# Altium footprint library AI.PcbLib: 137 footprints (part 8 of 9)
Each footprint in its own frame and in the unit in brackets; x right, y up, seen from the top. Pads: shape width x height; smd on the part's side, far side on the other; paste and mask are expansions set on the pad; w line width, h text height; cw(c..) or ccw(c..) is an arc to the next point about the centre after c.
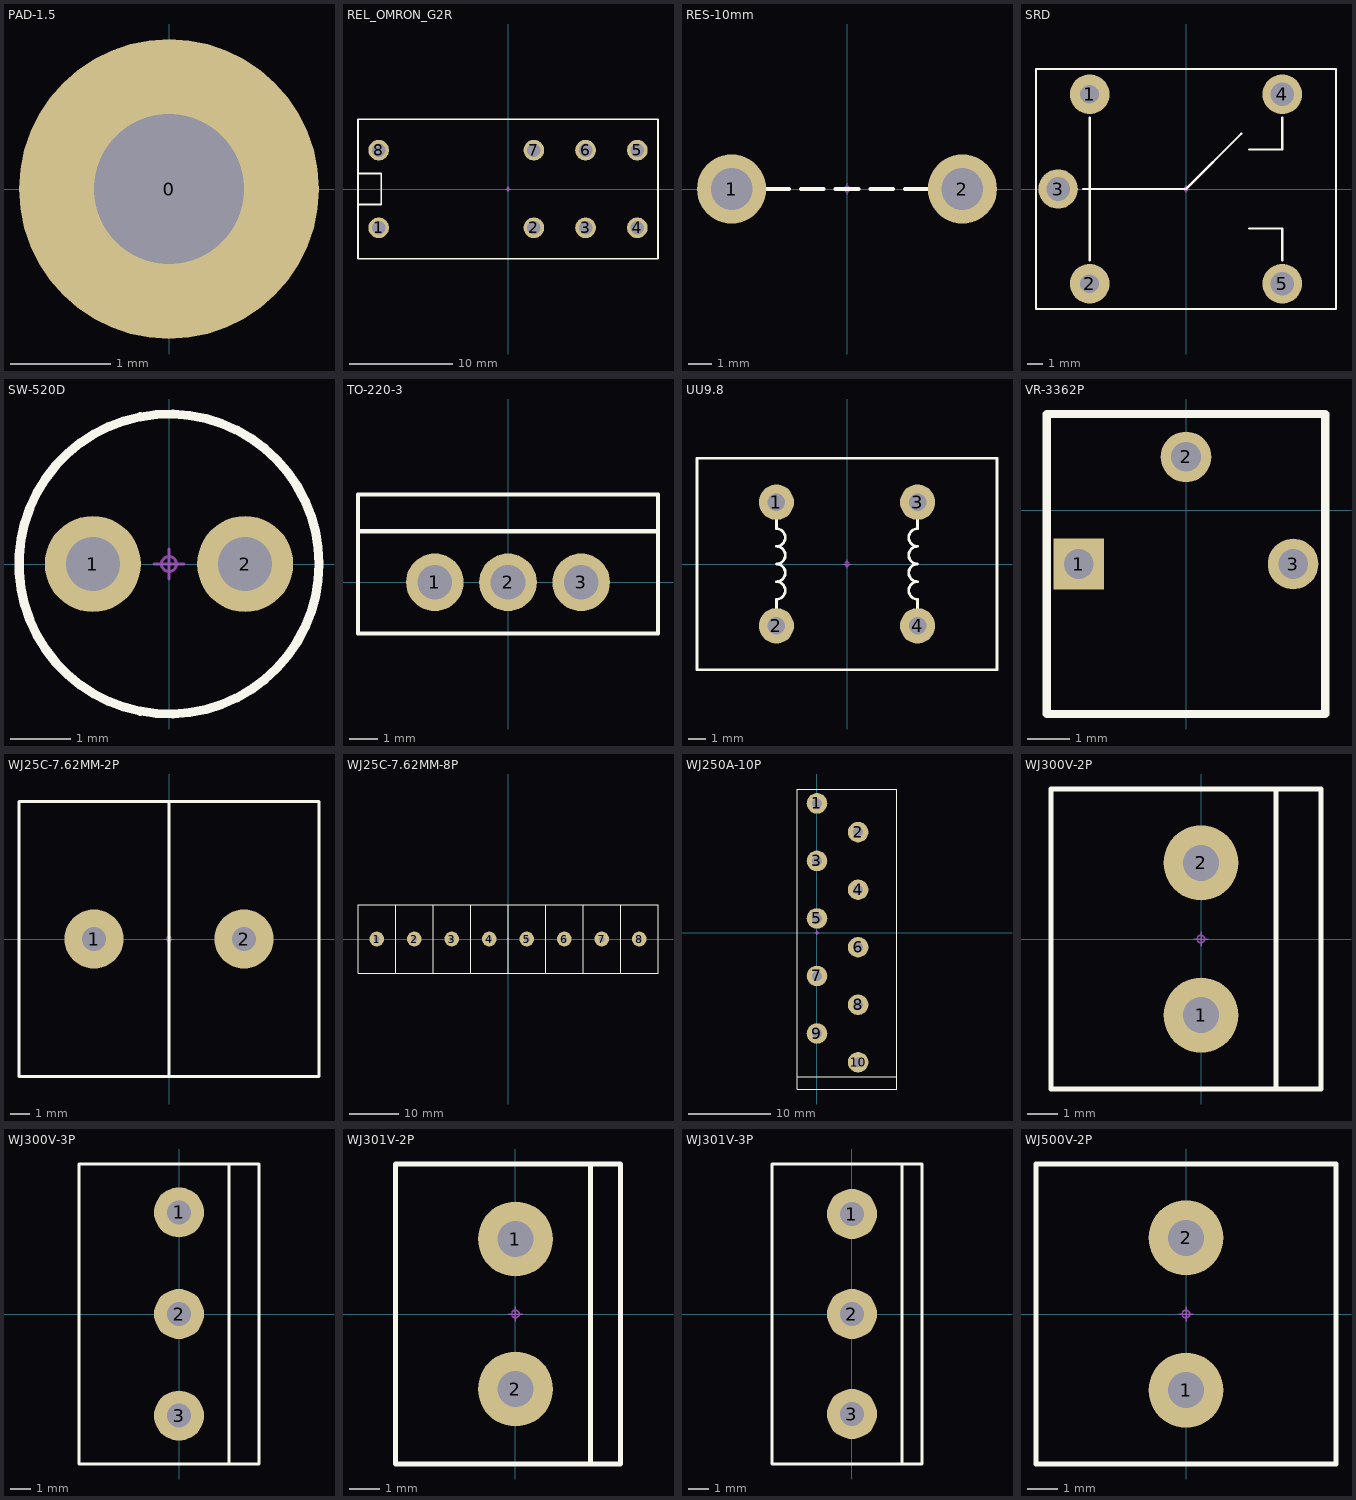
[diagram p7: the footprints below, top view; thin cyan lines are the x and y axes]

## PAD-1.5 [mm]
pads (1):
  round 3 hole 1.5: 0(0,0)
Mechanical 15:
  circle w0.05: c0,0 r0.125
  lines w0.05: -0.25,0 0.25,0 ; 0,-0.25 0,0.25

## REL_OMRON_G2R [mm]
pads (8):
  round 2 hole 1.3: 1(-12.5,-3.75) 2(2.5,-3.75) 3(7.5,-3.75) 4(12.5,-3.75) 5(12.5,3.75) 6(7.5,3.75) 7(2.5,3.75) 8(-12.5,3.75)
Top Overlay:
  lines w0.152: -14.5,-1.5 -12.25,-1.5 -12.25,1.5 -14.5,1.5 ; -14.5,-6.75 -14.5,6.75 14.5,6.75 14.5,-6.75 -14.5,-6.75
Mechanical 15:
  circle w0.05: c0,0 r0.125
  lines w0.05: -0.25,0 0.25,0 ; 0,-0.25 0,0.25
3D body "REL_OMRON_G2RG-2A4.stp": height 25.5, standoff -3.6, extent -14.5,-6.75 14.5,6.75

## RES-10mm [mm]
pads (2):
  round 3 hole 1.8: 1(-5,0) 2(5,0)
Top Overlay:
  lines w0.152: -3.5,0 -2.5,0 ; -2,0 -1,0 ; -0.5,0 0.5,0 ; 1,0 2,0 ; 2.5,0 3.5,0
Mechanical 15:
  circle w0.05: c0,0 r0.125
  lines w0.05: -0.25,0 0.25,0 ; 0,-0.25 0,0.25
3D body "RES1016-720X250.stp": height 2.5, standoff -3.2, extent -5.38,-1.25 5.38,1.25

## SRD [mm]
pads (5):
  round 2.5 hole 1.2: 1(-6.1,6) 2(-6.1,-6)
  round 2.5 hole 1.5: 3(-8.1,0) 4(6.1,6) 5(6.1,-6)
Top Overlay:
  lines w0.152: -6.5,0 0,0 3.5,3.5 ; -6.1,-4.5 -6.1,4.5 ; 4,-2.5 6.1,-2.5 6.1,-4.5 ; 4,2.5 6.1,2.5 6.1,4.5 ; -9.5,-7.6 9.5,-7.6 9.5,7.6 -9.5,7.6 -9.5,-7.6
Mechanical 15:
  circle w0.05: c0,0 r0.125
  lines w0.05: -0.25,0 0.25,0 ; 0,-0.25 0,0.25
3D body "User Library-SONGLE Relay SRU-12VDC-SL-C.STEP": height 15.3, standoff -5, extent -9.5,-7.75 9.6,7.75

## SW-520D [mm]
pads (2):
  round 1.6 hole 0.9: 1(-1.27,0) 2(1.27,0)
Top Overlay:
  circle w0.152: c0,0 r2.5
Mechanical 15:
  circle w0.05: c0,0 r0.125
  lines w0.05: -0.25,0 0.25,0 ; 0,-0.25 0,0.25
3D body "sw-520d.stp": height 12, standoff -12, extent -2.5,-2.5 2.5,2.5

## TO-220-3 [mm]
pads (3):
  round 2 hole 1.2: 1(-2.54,0) 2(0,0) 3(2.54,0)
Top Overlay:
  lines w0.152: -5.207,1.778 5.207,1.778 ; -5.207,-1.778 -5.207,3.048 5.207,3.048 5.207,-1.778 -5.207,-1.778
Mechanical 14:
  lines w0.1: -5.207,1.778 5.207,1.778 ; -5.207,-1.778 -5.207,3.048 5.207,3.048 5.207,-1.778 -5.207,-1.778
Mechanical 15:
  circle w0.05: c0,0 r0.125
  lines w0.05: -0.25,0 0.25,0 ; 0,-0.25 0,0.25
3D body "TO-220-V.stp": height 20.5, standoff -3.5, extent -5.27,-1.75 5.27,2.95

## UU9.8 [mm]
pads (4):
  round 2 hole 1: 1(-4,3.5) 2(-4,-3.5) 3(4,3.5) 4(4,-3.5)
Top Overlay:
  lines w0.152: -4,-2.5 -4,-2 ccw(c-4,-1.5) -4,-1 ccw(c-4,-0.5) -4,0 ccw(c-4,0.5) -4,1 ccw(c-4,1.5) -4,2 -4,2.5 ; 4,-2.5 4,-2.5 ; 4,-2.5 4,-2 cw(c4,-1.5) 4,-1 cw(c4,-0.5) 4,0 cw(c4,0.5) 4,1 cw(c4,1.5) 4,2 4,2.5 ; 4,2.5 4,2.5 ; -8.5,-6 -8.5,6 8.5,6 8.5,-6 -8.5,-6
Mechanical 15:
  circle w0.05: c0,0 r0.125
  lines w0.05: -0.25,0 0.25,0 ; 0,-0.25 0,0.25

## VR-3362P [mm] "Feed-Through Capacitor; 3 Leads"
pads (3):
  rect 1.2x1.2 hole 0.7: 1(-2.54,-1.27)
  round 1.2 hole 0.7: 2(0,1.27) 3(2.54,-1.27)
Top Overlay:
  lines w0.2: -3.302,-4.826 -3.302,2.286 3.302,2.286 3.302,-4.826 -3.302,-4.826

## WJ25C-7.62MM-2P [mm] "ONSHORE"
height 13
pads (2):
  round 3 hole 1.2: 1(-3.81,0) 2(3.81,0)
Top Overlay:
  lines w0.152: 0,-6.985 0,6.985 ; -7.62,-6.985 7.62,-6.985 7.62,6.985 -7.62,6.985 -7.62,-6.985
Mechanical 15:
  circle w0.05: c0,0 r0.125
  lines w0.05: -0.25,0 0.25,0 ; 0,-0.25 0,0.25

## WJ25C-7.62MM-8P [mm] "ONSHORE"
height 13
pads (8):
  round 3 hole 1.2: 1(-26.67,0) 2(-19.05,0) 3(-11.43,0) 4(-3.81,0) 5(3.81,0) 6(11.43,0) 7(19.05,0) 8(26.67,0)
Top Overlay:
  lines w0.152: -22.86,-6.985 -22.86,6.985 ; -15.24,-6.985 -15.24,6.985 ; -7.62,-6.985 -7.62,6.985 ; 0,-6.985 0,6.985 ; 7.62,-6.985 7.62,6.985 ; 15.24,-6.985 15.24,6.985 ; 22.86,-6.985 22.86,6.985 ; -30.48,-6.985 30.48,-6.985 30.48,6.985 -30.48,6.985 -30.48,-6.985
Mechanical 15:
  circle w0.05: c0,0 r0.125
  lines w0.05: -0.25,0 0.25,0 ; 0,-0.25 0,0.25

## WJ250A-10P [mm] "ONSHORE"
height 13
pads (10):
  round 2.5 hole 1.2: 1(0,15.75) 2(5,12.25) 3(0,8.75) 4(5,5.25) 5(0,1.75) 6(5,-1.75) 7(0,-5.25) 8(5,-8.75) 9(0,-12.25) 10(5,-15.75)
Top Overlay:
  lines w0.152: -2.4,-17.5 -2.4,17.5 9.7,17.5 9.7,-17.5 ; -2.4,-17.5 9.7,-17.5 ; -2.4,-17.5 -2.4,-19 9.7,-19 9.7,-17.5
Mechanical 15:
  circle w0.05: c0,0 r0.125
  lines w0.05: -0.25,0 0.25,0 ; 0,-0.25 0,0.25

## WJ300V-2P [mm] "ONSHORE"
height 13
pads (2):
  round 2.5 hole 1.2: 1(0,-2.54) 2(0,2.54)
Top Overlay:
  lines w0.152: 2.5,-5 2.5,5 ; -5,-5 4,-5 4,5 -5,5 -5,-5
Mechanical 15:
  circle w0.05: c0,0 r0.125
  lines w0.05: -0.25,0 0.25,0 ; 0,-0.25 0,0.25
3D body "jxdz-2.stp": height 12.5, standoff -4.15, extent -5,-5.725 4,4.975

## WJ300V-3P [mm] "ONSHORE"
height 13
pads (3):
  round 2.5 hole 1.2: 1(0,5.08) 2(0,0) 3(0,-5.08)
Top Overlay:
  lines w0.152: 2.5,-7.5 2.5,7.5 ; -5,-7.5 4,-7.5 4,7.5 -5,7.5 -5,-7.5
Mechanical 15:
  circle w0.05: c0,0 r0.125
  lines w0.05: -0.25,0 0.25,0 ; 0,-0.25 0,0.25
3D body "jxdz-3.stp": height 12.5, standoff -3.9, extent -5,-8.225 4,7.475

## WJ301V-2P [mm]
pads (2):
  round 2.5 hole 1.2: 1(0,2.5) 2(0,-2.5)
Top Overlay:
  lines w0.152: 2.5,-5 2.5,5 ; -4,-5 -4,5 3.5,5 3.5,-5 -4,-5
Mechanical 15:
  circle w0.05: c0,0 r0.125
  lines w0.05: -0.25,0 0.25,0 ; 0,-0.25 0,0.25
3D body "3A-2way.step": height 10, standoff -3, extent -4.1,-5.6 3.5,5

## WJ301V-3P [mm]
pads (3):
  round 2.5 hole 1.2: 1(0,5) 2(0,0) 3(0,-5)
Top Overlay:
  lines w0.152: 2.5,-7.5 2.5,7.5 ; -4,-7.5 -4,7.5 3.5,7.5 3.5,-7.5 -4,-7.5
Mechanical 15:
  circle w0.05: c0,0 r0.125
  lines w0.05: -0.25,0 0.25,0 ; 0,-0.25 0,0.25
3D body "User Library-Terminal-Screw-3A-3way.step": height 10, standoff -3, extent -4,-8.1 3.6,7.5

## WJ500V-2P [mm] "ONSHORE"
height 13
pads (2):
  round 2.5 hole 1.2: 1(0,-2.54) 2(0,2.54)
Top Overlay:
  lines w0.152: -5,-5 5,-5 5,5 -5,5 -5,-5
Mechanical 15:
  circle w0.05: c0,0 r0.125
  lines w0.05: -0.25,0 0.25,0 ; 0,-0.25 0,0.25
3D body "jxdz2-2.stp": height 14, standoff -4, extent -5,-5 5,5